# Altium footprint library MainFPs.PcbLib: 215 footprints (part 11 of 14)
Each footprint in its own frame and in the unit in brackets; x right, y up, seen from the top. Pads: shape width x height; smd on the part's side, far side on the other; paste and mask are expansions set on the pad; w line width, h text height; cw(c..) or ccw(c..) is an arc to the next point about the centre after c.
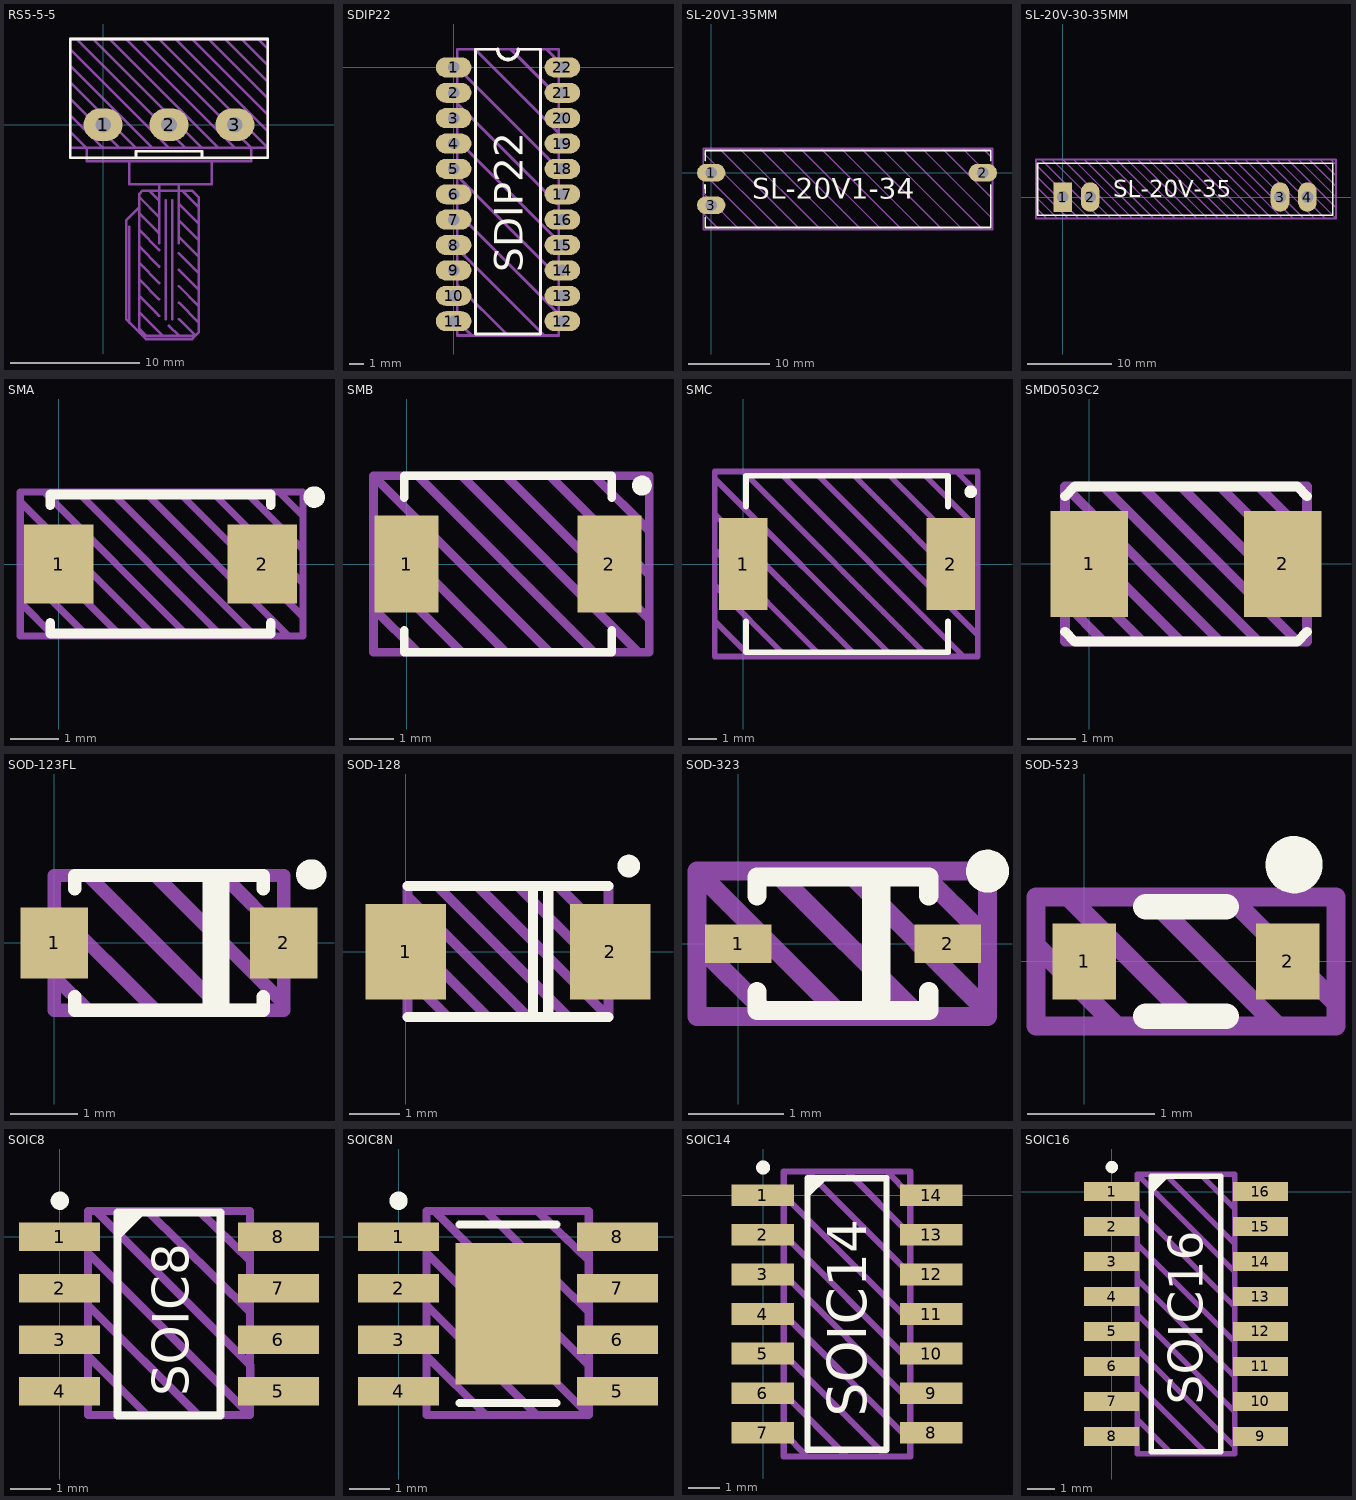
[diagram p10: the footprints below, top view; thin cyan lines are the x and y axes]

## RS5-5-5 [mm]
pads (3):
  oval 3x2.5 hole 1.2: 1(0,0) 2(5.08,0) 3(10.16,0)
Top Overlay:
  lines w0.2: 2.54,-2.54 2.54,-2.032 7.62,-2.032 7.62,-2.54 ; 12.446,-2.54 -2.54,-2.54 -2.54,6.604 12.7,6.604 12.7,-2.54 ; 12.446,-2.54 12.7,-2.54 ; 12.446,-2.54 12.7,-2.54
Top Draw:
  lines w0.2: -2.54,-0.508 -1.27,-1.778 -1.27,-2.794 11.43,-2.794 11.43,-1.778 3.048,6.604 ; -2.54,0.762 0,-1.778 ; -2.54,2.032 1.27,-1.778 ; -2.54,3.302 2.54,-1.778 ; -2.54,4.572 3.81,-1.778 ; -2.54,5.842 5.08,-1.778 ; -2.032,6.604 6.35,-1.778 ; -1.016,-1.778 0.254,-1.778 ; -0.762,6.604 7.62,-1.778 ; 0.508,6.604 8.89,-1.778 ; 1.524,-1.778 2.794,-1.778 ; 1.778,6.604 10.16,-1.778 ; 2.032,-15.24 2.032,-7.874 ; 2.032,-2.794 2.032,-4.572 8.382,-4.572 8.382,-2.794 ; 2.794,-15.748 3.302,-16.256 ; 2.794,-14.478 4.572,-16.256 ; 2.794,-13.208 4.064,-14.478 4.318,-14.732 ; 2.794,-11.938 4.318,-13.462 ; 2.794,-10.668 4.318,-12.192 ; 2.794,-9.398 4.318,-10.922 ; 2.794,-8.128 4.318,-9.652 ; 2.794,-6.858 4.064,-8.128 4.318,-8.382 ; 2.794,-6.35 1.778,-7.366 1.778,-14.986 2.794,-16.002 ; 2.794,-2.794 4.064,-2.794 ; 3.556,-5.08 3.81,-5.334 4.318,-5.842 ; 4.064,-16.256 5.334,-16.256 ; 4.064,-1.778 5.334,-1.778 ; 4.318,-9.144 4.318,-4.572 ; 4.318,-7.112 2.794,-5.588 ; 4.318,6.604 12.7,-1.778 ; 4.826,-14.986 4.826,-13.462 4.826,-5.842 ; 5.08,-15.494 5.842,-16.256 ; 5.334,-14.986 5.334,-13.462 5.334,-5.842 ; 5.334,-2.794 6.604,-2.794 ; 5.588,6.604 12.7,-0.508 ; 5.842,-14.986 7.112,-16.256 ; 5.842,-13.716 7.366,-15.24 ; 5.842,-12.446 7.366,-13.97 ; 5.842,-11.176 7.366,-12.7 ; 5.842,-9.906 7.366,-11.43 ; 5.842,-9.144 5.842,-4.572 7.112,-4.572 ; 5.842,-8.636 7.366,-10.16 ; 5.842,-7.366 7.366,-8.89 ; 5.842,-6.096 7.366,-7.62 ; 6.096,-5.08 6.35,-5.334 7.366,-6.35 ; 6.604,-1.778 7.874,-1.778 ; 6.858,6.604 12.7,0.762 ; 8.128,6.604 12.7,2.032 ; 9.144,-1.778 10.414,-1.778 ; 9.398,6.604 12.7,3.302 ; 10.668,6.604 12.7,4.572 ; 11.938,6.604 12.7,5.842 ; 2.794,-16.002 2.794,-14.224 2.794,-5.588 ; 2.794,-16.002 3.048,-16.256 ; 2.794,-5.588 2.794,-5.334 3.048,-5.08 6.858,-5.08 7.112,-5.334 7.366,-5.588 7.366,-13.716 7.366,-15.494 7.366,-16.002 7.112,-16.256 ; 3.048,-16.256 3.302,-16.51 6.858,-16.51 7.112,-16.256 ; 3.048,-16.256 7.112,-16.256 ; 12.7,-1.778 -2.54,-1.778 -2.54,6.604 12.7,6.604 12.7,-1.778
Top Info:
  text "'.Comment'" at 0,-20.32 h1.25
3D body: height 8.13, standoff 7.11, extent 1.118,-18.796 8.633,-16.383
3D body: height 7.87, standoff 7.37, extent 0.762,-18.796 3.46,-16.002
3D body: height 8.13, standoff 7.11, extent 0.762,-16.383 1.653,-2.413
3D body: height 11.18, standoff 4.06, extent 1.524,-16.383 8.636,-2.413
3D body: height 12.19, standoff 3.05, extent 0.508,-1.778 9.652,-1.016
3D body: height 15.19, standoff 0.05, extent -2.489,0.254 12.649,6.604
3D body: height 13.21, standoff 2.03, extent -0.508,-0.254 10.668,1.016
3D body: height 15.24, standoff 0, extent -2.54,-0.635 12.7,-0.254
3D body: height 7.62, standoff 0.13, extent -2.54,-0.635 12.7,-0.254
3D body: height 0.25, standoff -2.29, extent 9.779,-0.254 10.541,0.254
3D body: height 0.25, standoff -2.29, extent 4.699,-0.254 5.461,0.254
3D body: height 0.25, standoff -2.29, extent -0.381,-0.254 0.381,0.254
3D body: height 5.08, standoff 0.23, extent -1.651,-0.254 1.651,0.254
3D body: height 5.08, standoff 0.23, extent 3.429,-0.254 6.731,0.254
3D body: height 5.08, standoff 0.23, extent 8.509,-0.254 11.811,0.254
3D body: height 10.16, standoff 4.57, extent -1.905,-1.016 12.065,-0.635
3D body: height 9.65, standoff 5.59, extent 3.048,-14.478 7.112,-1.778
3D body: height 7.87, standoff 7.37, extent 0.737,-16.027 0.787,-2.667
3D body: height 7.87, standoff 7.37, extent 0.737,-2.667 1.016,-2.413
3D body: height 4.06, standoff 1.02, extent -1.524,-0.762 1.524,-0.508
3D body: height 4.06, standoff 1.02, extent 3.556,-0.762 6.604,-0.508
3D body: height 4.06, standoff 1.02, extent 8.636,-0.762 11.684,-0.508

## SDIP22 [mm]
pads (22):
  oval 2.5x1.4 hole 0.8: 1(0,0) 2(0,-1.778) 3(0,-3.556) 4(0,-5.334) 5(0,-7.112) 6(0,-8.89) 7(0,-10.668) 8(0,-12.446) 9(0,-14.224) 10(0,-16.002) 11(0,-17.78) 12(7.62,-17.78) 13(7.62,-16.002) 14(7.62,-14.224) 15(7.62,-12.446) 16(7.62,-10.668) 17(7.62,-8.89) 18(7.62,-7.112) 19(7.62,-5.334) 20(7.62,-3.556) 21(7.62,-1.778) 22(7.62,0)
Top Overlay:
  lines w0.2: 3.048,1.27 1.524,1.27 1.524,-18.669 6.096,-18.669 6.096,1.27 4.572,1.27
  lines w0.25: 3.092,1.27 ccw(c3.81,1.27) 4.528,1.27
  text "SDIP22" at 4.826,-14.351 h2
Top Draw:
  lines w0.2: 0.254,-17.78 1.27,-18.796 2.54,-18.796 ; 0.254,-15.24 3.81,-18.796 7.366,-18.796 ; 0.254,-12.7 6.35,-18.796 7.366,-18.796 ; 0.254,-10.16 7.366,-17.272 ; 0.254,-7.62 7.366,-14.732 ; 0.254,-5.08 7.366,-12.192 7.366,-14.732 ; 0.254,-2.54 7.366,-9.652 7.366,-14.732 ; 0.254,0 7.366,-7.112 7.366,-10.16 ; 1.5,1.27 7.366,-4.596 7.366,-6.5 ; 4,1.27 7.366,-2.096 7.366,-4 ; 6.5,1.27 7.366,0.404 7.366,-0.5 ; 7.366,-18.796 7.366,-17.272 ; 7.366,-18.796 7.366,1.27 0.254,1.27 0.254,-18.796 7.366,-18.796 ; 7.366,-17.272 7.366,-14.732
Top Info:
  text "'.Comment'" at -0.381,-20.32 h1
3D body: height 2.09, standoff 0.31, extent 7.112,-2.278 7.747,-1.278
3D body: height 0.38, standoff -3, extent 7.493,-2.032 7.747,-1.524
3D body: height 2.09, standoff 0.31, extent 7.112,-0.5 7.747,0.5
3D body: height 0.38, standoff -3, extent 7.493,-0.254 7.747,0.254
3D body: height 2.09, standoff 0.31, extent 7.112,-4.056 7.747,-3.056
3D body: height 0.38, standoff -3, extent 7.493,-3.81 7.747,-3.302
3D body: height 2.09, standoff 0.31, extent 7.112,-7.612 7.747,-6.612
3D body: height 0.38, standoff -3, extent 7.493,-7.366 7.747,-6.858
3D body: height 2.09, standoff 0.31, extent 7.112,-5.834 7.747,-4.834
3D body: height 0.38, standoff -3, extent 7.493,-5.588 7.747,-5.08
3D body: height 2.09, standoff 0.31, extent 7.112,-9.39 7.747,-8.39
3D body: height 0.38, standoff -3, extent 7.493,-9.144 7.747,-8.636
3D body: height 2.09, standoff 0.31, extent 7.112,-12.946 7.747,-11.946
3D body: height 0.38, standoff -3, extent 7.493,-12.7 7.747,-12.192
3D body: height 2.09, standoff 0.31, extent 7.112,-11.168 7.747,-10.168
3D body: height 0.38, standoff -3, extent 7.493,-10.922 7.747,-10.414
3D body: height 2.09, standoff 0.31, extent 7.112,-14.724 7.747,-13.724
3D body: height 0.38, standoff -3, extent 7.493,-14.478 7.747,-13.97
3D body: height 2.09, standoff 0.31, extent 7.112,-18.28 7.747,-17.28
3D body: height 0.38, standoff -3, extent 7.493,-18.034 7.747,-17.526
3D body: height 2.09, standoff 0.31, extent 7.112,-16.502 7.747,-15.502
3D body: height 0.38, standoff -3, extent 7.493,-16.256 7.747,-15.748
3D body: height 2.09, standoff 0.31, extent -0.127,-16.502 0.508,-15.502
3D body: height 0.38, standoff -3, extent -0.127,-16.256 0.127,-15.748
3D body: height 2.09, standoff 0.31, extent -0.127,-18.28 0.508,-17.28
3D body: height 0.38, standoff -3, extent -0.127,-18.034 0.127,-17.526
3D body: height 2.09, standoff 0.31, extent -0.127,-14.724 0.508,-13.724
3D body: height 0.38, standoff -3, extent -0.127,-14.478 0.127,-13.97
3D body: height 2.09, standoff 0.31, extent -0.127,-11.168 0.508,-10.168
3D body: height 0.38, standoff -3, extent -0.127,-10.922 0.127,-10.414
3D body: height 2.09, standoff 0.31, extent -0.127,-12.946 0.508,-11.946
3D body: height 0.38, standoff -3, extent -0.127,-12.7 0.127,-12.192
3D body: height 2.09, standoff 0.31, extent -0.127,-9.39 0.508,-8.39
3D body: height 0.38, standoff -3, extent -0.127,-9.144 0.127,-8.636
3D body: height 2.09, standoff 0.31, extent -0.127,-5.834 0.508,-4.834
3D body: height 0.38, standoff -3, extent -0.127,-5.588 0.127,-5.08
3D body: height 2.09, standoff 0.31, extent -0.127,-7.612 0.508,-6.612
3D body: height 0.38, standoff -3, extent -0.127,-7.366 0.127,-6.858
3D body: height 2.09, standoff 0.31, extent -0.127,-4.056 0.508,-3.056
3D body: height 0.38, standoff -3, extent -0.127,-3.81 0.127,-3.302
3D body: height 2.09, standoff 0.31, extent -0.127,-0.5 0.508,0.5
3D body: height 0.38, standoff -3, extent -0.127,-0.254 0.127,0.254
3D body: height 2.09, standoff 0.31, extent -0.127,-2.278 0.508,-1.278
3D body: height 0.38, standoff -3, extent -0.127,-2.032 0.127,-1.524
3D body: height 3, standoff 2, extent 0.508,-18.542 7.112,1.016
3D body: height 2.03, standoff 0.25, extent 0.508,-18.542 7.112,1.016

## SL-20V1-35MM [mm]
pads (3):
  oval 3.5x2.2 hole 1.4: 1(0,0) 2(33.5,0) 3(0,-4)
Top Overlay:
  lines w0.2: -0.762,-1.5 -0.75,-2.5 ; -0.75,-5.5 -0.75,-6.75 34.5,-6.75 34.5,-1.5 ; -0.75,1.5 -0.75,2.75 34.5,2.75 34.5,1.5
  text "SL-20V1-34" at 5.08,-3.175 h2.5
Top Draw:
  lines w0.2: -1,-5 1,-7 2.5,-7 ; -1,-2.5 3.5,-7 7.5,-7 ; -1,0 6,-7 12.5,-7 ; -1,2.5 8.5,-7 12.5,-7 ; 1,3 11,-7 12.5,-7 ; 3.5,3 13.5,-7 15,-7 ; 6,3 16,-7 20,-7 ; 8.5,3 18.5,-7 22.5,-7 ; 11,3 21,-7 25,-7 ; 13.5,3 23.5,-7 27.5,-7 ; 16,3 26,-7 30,-7 ; 18.5,3 28.5,-7 32.5,-7 ; 21,3 31,-7 ; 23.5,3 33.5,-7 ; 26,3 34.7,-5.7 ; 28.5,3 34.7,-3.2 ; 30.45,-7 34.7,-7 ; 31,3 34.7,-0.7 ; 32.95,-7 34.7,-7 ; 33.5,3 34.7,1.8 ; 34.7,-7 34.7,-6.1 34.7,3 -1,3 -1,-7 34.7,-7
Top Info:
  text "'.Comment'" at -0.635,-9.525 h2
3D body: height 5.5, standoff 5.4, extent 3,-0.6 31.5,2.7
3D body: height 5.5, standoff 5.4, extent 3,-6.8 31.5,-3.5
3D body: height 5.5, standoff 5, extent -0.5,-6.9 3.5,2.8
3D body: height 3, standoff 0.3, extent 6.3,2.6 9.8,2.8
3D body: height 3, standoff 0, extent 11.3,2.6 13.3,2.8
3D body: height 0.3, standoff 0, extent 11.3,2.1 13.3,2.8
3D body: height 0.3, standoff 0, extent 6.3,1.9 9.8,2.8
3D body: height 0.3, standoff 0, extent 24.2,1.9 27.7,2.8
3D body: height 0.3, standoff 0, extent 20.7,2.1 22.7,2.8
3D body: height 3, standoff 0, extent 20.7,2.6 22.7,2.8
3D body: height 3, standoff 0.3, extent 24.2,2.6 27.7,2.8
3D body: height 3, standoff 0.3, extent 24.2,-6.9 27.7,-6.7
3D body: height 3, standoff 0, extent 20.7,-6.9 22.7,-6.7
3D body: height 0.3, standoff 0, extent 20.7,-6.9 22.7,-6.2
3D body: height 0.3, standoff 0, extent 24.2,-6.9 27.7,-6
3D body: height 0.3, standoff 0, extent 6.3,-6.9 9.8,-6
3D body: height 0.3, standoff 0, extent 11.3,-6.9 13.3,-6.2
3D body: height 3, standoff 0, extent 11.3,-6.9 13.3,-6.7
3D body: height 3, standoff 0.3, extent 6.3,-6.9 9.8,-6.7
3D body: height 5.4, standoff 1.5, extent -0.4,-6.9 34.4,-6.7
3D body: height 5.4, standoff 1.5, extent -0.4,2.6 34.4,2.8
3D body: height 5.4, standoff 1.7, extent -0.5,-6.9 -0.2,2.8
3D body: height 5.4, standoff 1.7, extent 34.2,-6.9 34.5,2.8
3D body: height 1.5, standoff 0.1, extent -0.254,-0.7 0.254,0.7
3D body: height 0.1, standoff -1.78, extent 33.246,-0.508 33.754,0.508
3D body: height 0.1, standoff -1.78, extent -0.254,-4.508 0.254,-3.492
3D body: height 0.1, standoff -1.78, extent -0.254,-0.508 0.254,0.508
3D body: height 2, standoff 0.3, extent -0.2,-6.7 34.2,2.6
3D body: height 4.5, standoff 4, extent 5.427,-4.016 13.237,0.032
3D body: height 10.5, standoff 4.4, extent 6.6,-2.6 12.1,-1.4
3D body: height 1.5, standoff 0.1, extent -0.254,-4.7 0.254,-3.3
3D body: height 1.5, standoff 0.1, extent 33.746,-0.7 34.254,0.7
3D body: height 5.5, standoff 5, extent 30.5,-6.9 34.5,2.8
3D body: height 15.5, standoff 6, extent 7.5,-2.6 11.2,-1.4
3D body: height 5.5, standoff 4.5, extent 3,-4 3.5,0
3D body: height 5.5, standoff 4.5, extent 30.5,-4.3 31.05,-0.3
3D body: height 5.5, standoff 4.5, extent 3,-0.6 31.05,0
3D body: height 5.5, standoff 4.5, extent 3,-4.1 31.05,-3.5

## SL-20V-30-35MM [mm]
pads (4):
  rect 2.2x3.5 hole 1.4: 1(0,0)
  oval 2.2x3.5 hole 1.4: 2(3.25,0) 3(25.75,0) 4(29,0)
Top Overlay:
  lines w0.2: -3,-1 -3,4 32,4 32,0 32,-2.175 -0.175,-2.175 -3,-2.175 -3,0
  text "SL-20V-35" at 6,0 h2
Top Draw:
  lines w0.2: -3.175,-1.27 -1.905,-2.54 -1.27,-2.54 ; -3.175,0 -0.635,-2.54 1.27,-2.54 ; -3.175,1.27 0.635,-2.54 2.54,-2.54 ; -3.175,2.54 1.905,-2.54 5.08,-2.54 3.175,-2.54 -3.175,3.81 ; -2.54,4.445 4.445,-2.54 5.842,-2.54 ; -1.27,4.445 5.715,-2.54 8.89,-2.54 8.255,-2.54 1.27,4.445 ; 0,4.445 6.985,-2.54 10.16,-2.54 ; 2.54,4.445 9.525,-2.54 12.7,-2.54 12.065,-2.54 5.08,4.445 ; 3.81,4.445 10.795,-2.54 15.24,-2.54 ; 6.35,4.445 13.335,-2.54 14.605,-2.54 ; 7.62,4.445 14.605,-2.54 ; 8.89,4.445 15.875,-2.54 16.51,-2.54 14.605,-2.54 ; 10.16,4.445 17.145,-2.54 19.05,-2.54 ; 11.43,4.445 18.415,-2.54 20.32,-2.54 19.685,-2.54 12.7,4.445 ; 13.97,4.445 20.955,-2.54 24.13,-2.54 22.225,-2.54 15.24,4.445 ; 16.51,4.445 23.495,-2.54 26.67,-2.54 ; 17.78,4.445 24.765,-2.54 29.21,-2.54 ; 19.05,4.445 26.035,-2.54 27.94,-2.54 27.305,-2.54 20.32,4.445 ; 21.59,4.445 28.575,-2.54 30.48,-2.54 ; 22.86,4.445 29.845,-2.54 31.75,-2.54 31.115,-2.54 24.13,4.445 ; 25.4,4.445 32.385,-2.54 ; 26.67,4.445 32.385,-1.27 ; 27.94,4.445 32.385,0 32.385,-0.635 ; 29.21,4.445 32.385,1.27 32.385,0.953 ; 30.48,4.445 32.385,2.54 32.385,3.81 31.75,4.445 ; 32.385,-2.54 -3.175,-2.54 -3.175,4.445 32.385,4.445 32.385,-2.54
Top Info:
  text "'.Comment'" at -3.175,-5.08 h2
3D body: height 6, standoff 3, extent 28.448,-0.803 28.6,3
3D body: height 6, standoff 3, extent 0.2,-0.803 28.6,-0.597
3D body: height 6, standoff 3, extent 0.3,2.794 28.7,3
3D body: height 0.1, standoff -1.78, extent 28.492,-0.254 29.508,0.254
3D body: height 0.1, standoff -1.78, extent 25.242,-0.254 26.258,0.254
3D body: height 0.1, standoff -1.78, extent 2.742,-0.254 3.758,0.254
3D body: height 0.1, standoff -1.78, extent -0.508,-0.254 0.508,0.254
3D body: height 10, standoff 5.8, extent 3.175,0.635 8.636,1.397
3D body: height 5.9, standoff 5, extent 2.032,-1 9.842,3.048
3D body: height 6, standoff 5.9, extent -3.302,-2.413 32.258,-0.6
3D body: height 6, standoff 5.9, extent -3.302,2.794 32.258,4.572
3D body: height 6, standoff 5.9, extent 28.448,-2.413 32.258,4.572
3D body: height 6, standoff 5.9, extent -3.302,-2.413 0.508,4.572
3D body: height 2, standoff 0, extent 20.955,4.445 23.495,4.572
3D body: height 2, standoff 0, extent 5.461,4.445 8.001,4.572
3D body: height 2, standoff 0, extent -3.302,-2.413 -2.413,-2.286
3D body: height 5.6, standoff 0.9, extent -3.302,4.445 32.258,4.572
3D body: height 5.6, standoff 0.9, extent -3.302,-2.413 32.258,-2.286
3D body: height 6, standoff 0.9, extent 32.131,-2.159 32.258,4.318
3D body: height 6, standoff 0.9, extent -3.302,-2.159 -3.175,4.318
3D body: height 2, standoff 0.1, extent -3.175,-2.286 32.131,4.445
3D body: height 2, standoff 0, extent -3.302,4.445 -2.413,4.572
3D body: height 2, standoff 0, extent 31.369,4.445 32.258,4.572
3D body: height 2, standoff 0, extent 31.369,-2.413 32.258,-2.286
3D body: height 2, standoff 0, extent 5.461,-2.413 8.001,-2.286
3D body: height 2, standoff 0, extent 20.955,-2.413 23.495,-2.286
3D body: height 6, standoff 3, extent 0.356,-0.803 0.508,3

## SMA [mm] "DO-214AC"
pads (2):
  rect 1.45x1.65 smd: 1(0,0) 2(4.25,0)
Top Overlay:
  circle w0.25: c5.334,1.397 r0.1
  lines w0.2: -0.175,-1.225 -0.175,-1.45 4.425,-1.45 4.425,-1.225 ; -0.175,1.225 -0.175,1.45 4.425,1.45 4.425,1.225
Top Draw:
  lines w0.15: -0.8,-0.8 -0.1,-1.5 0,-1.5 ; -0.8,-0.1 0.6,-1.5 1,-1.5 ; -0.8,0.6 1.3,-1.5 1.6,-1.5 ; -0.8,1.3 2,-1.5 2.1,-1.5 ; -0.4,1.5 -0.3,1.5 2.7,-1.5 ; 0,1.5 0.4,1.5 3.4,-1.5 ; 0.6,1.5 1.1,1.5 4.1,-1.5 ; 1.4,1.5 1.8,1.5 4.8,-1.5 ; 2.4,1.5 2.5,1.5 5.1,-1.1 ; 3.2,1.5 5.1,-0.4 5.1,-0.5 ; 3.9,1.5 5.1,0.3 5.1,0 ; 4.6,1.5 5.1,1 5.1,0.8 ; -0.8,-1.5 5.1,-1.5 5.1,1.5 -0.8,1.5 -0.8,-1.5
Top Info:
  text "'.Comment'" at -0.866,-2.517 h0.75
3D body "SMAA.step": height 2.1, standoff 0, extent -0.395,-1.45 4.645,1.45

## SMB [mm] "DO-214AA"
pads (2):
  rect 1.45x2.2 smd: 1(0,0) 2(4.6,0)
Top Overlay:
  circle w0.25: c5.334,1.778 r0.1
  lines w0.2: -0.05,-1.5 -0.05,-2 4.65,-2 4.65,-1.5 ; -0.05,1.5 -0.05,2 4.65,2 4.65,1.5
Top Draw:
  lines w0.2: -0.75,-1 0.25,-2 0.5,-2 ; -0.75,0 1.25,-2 1.5,-2 ; -0.75,1 2.25,-2 2.5,-2 ; 0.25,2 4.25,-2 4.5,-2 ; 1.25,2 5.25,-2 ; 2.25,2 5.5,-1.25 ; 3.25,2 5.5,-0.25 ; 3.5,-2 3.25,-2 -0.75,2 ; 4.25,2 5.5,0.75 ; -0.75,2 -0.75,-2 5.5,-2 5.5,2 -0.75,2
Top Info:
  text "'.Comment'" at -0.739,-3.025 h0.75
3D body "SODFL127P600-8N.step": height 2.2, standoff 0, extent -0.375,-1.975 4.975,1.975

## SMC [mm] "DO-214AB"
pads (2):
  rect 1.7x3.25 smd: 1(0,0) 2(7.3,0)
Top Overlay:
  circle w0.25: c8.001,2.54 r0.1
  lines w0.2: 0.1,-2.025 0.1,-3.1 7.2,-3.1 7.2,-2.025 ; 0.1,2.025 0.1,3.1 7.2,3.1 7.2,2.025
Top Draw:
  lines w0.2: -1,-2 0.25,-3.25 0.75,-3.25 ; -1,-0.75 1.5,-3.25 1.75,-3.25 ; -1,0.5 2.75,-3.25 ; -1,1.75 4,-3.25 ; -1,3 5.25,-3.25 ; 0,3.25 6.5,-3.25 ; 1.25,3.25 7.75,-3.25 ; 2.5,3.25 8.25,-2.5 ; 3.75,3.25 8.25,-1.25 ; 5,3.25 8.25,0 ; 6.25,3.25 8.25,1.25 ; 7.5,3.25 8.25,2.5 ; -1,-3.25 -1,3.25 8.25,3.25 8.25,-3.25 -1,-3.25
Top Info:
  text "'.Comment'" at -0.943,-4.626 h1
3D body "SODFL127P600-8N.step": height 2.5, standoff 0, extent -0.325,-3.1 7.625,3.1

## SMD0503C2 [mm]
pads (2):
  rect 1.6x2.2 smd: 1(0,0) 2(4,0)
Top Overlay:
  lines w0.2: -0.5,-1.4 -0.3,-1.6 4.3,-1.6 4.5,-1.4 ; -0.5,1.4 -0.3,1.6 4.3,1.6 4.5,1.4
Top Draw:
  lines w0.2: -0.5,-0.8 0.3,-1.6 ; -0.5,0 1.1,-1.6 ; -0.5,0.8 1.9,-1.6 ; 0.3,1.6 3.5,-1.6 ; 1.1,1.6 4.3,-1.6 ; 1.9,1.6 4.5,-1 ; 2.7,-1.6 -0.5,1.6 ; 2.7,1.6 4.5,-0.2 ; 3.5,1.6 4.5,0.6 ; -0.5,1.6 -0.5,-1.6 4.5,-1.6 4.5,1.6 -0.5,1.6
Top Info:
  text "'.Comment'" at -0.124,-2.392 h0.5
3D body: height 1, standoff 0, extent -0.5,-1.6 4.5,1.6

## SOD-123FL [mm]
height 1.2
pads (2):
  rect 1x1.05 smd: 1(0,0) 2(3.4,0)
Top Overlay:
  circle w0.25: c3.81,1.016 r0.1
  lines w0.2: 0.3,-0.8 0.3,-1 3.1,-1 3.1,-0.8 ; 0.3,0.8 0.3,1 3.1,1 3.1,0.8 ; 2.3,-1 2.3,1 ; 2.4,-1 2.4,1 2.6,1 ; 2.5,1 2.5,-1 2.6,-1
Top Draw:
  lines w0.2: 0,-0.5 0.5,-1 0.8,-1 ; 0,0.5 1.5,-1 1.8,-1 ; 0.5,1 2.5,-1 2.7,-1 ; 1,-1 1.3,-1 ; 1.5,1 3.4,-0.9 ; 2,-1 2.3,-1 ; 2.5,1 3.4,0.1 3.4,-0.1 ; 3,-1 3.1,-1 ; 3.4,-0.9 3.4,-0.9 ; 0,-1 0,1 3.4,1 3.4,-1 0,-1
Top Info:
  text "'.Comment'" at -0.408,-1.678 h0.5
3D body "SOD-123FL.step": height 1.2, standoff 0, extent -0.175,-0.95 3.575,0.95

## SOD-128 [mm]
height 1.1
pads (2):
  rect 1.6x1.9 smd: 1(0,0) 2(4.064,0)
Top Overlay:
  circle w0.25: c4.432,1.7 r0.1
  lines w0.2: 0.032,-1.3 4.032,-1.3 ; 0.032,1.3 4.032,1.3 ; 2.532,-1.3 2.532,1.3 ; 2.832,-1.3 2.832,1.3
Top Draw:
  lines w0.2: 0.032,-0.5 0.832,-1.3 ; 0.032,0.3 1.632,-1.3 ; 0.032,1.1 2.432,-1.3 ; 0.632,1.3 3.232,-1.3 ; 1.432,1.3 4.032,-1.3 ; 2.232,1.3 4.032,-0.5 ; 3.032,1.3 4.032,0.3 ; 4.032,-1.3 0.032,-1.3 0.032,1.3 4.032,1.3 4.032,-1.3
Top Info:
  text "'.Comment'" at -1.154,-2.437 h0.75
3D body "SOD-128.step": height 1.1, standoff 0, extent -0.318,-1.35 4.382,1.35

## SOD-323 [mm]
height 0.7
pads (2):
  rect 0.7x0.4 smd: 1(0,0) 2(2.2,0)
Top Overlay:
  circle w0.25: c2.616,0.762 r0.1
  lines w0.2: 0.2,-0.502 0.2,-0.7 2,-0.7 2,-0.502 ; 0.2,0.502 0.2,0.7 2,0.7 2,0.502 ; 1.4,-0.7 1.4,0.7 ; 1.5,-0.7 1.5,0.7
Top Draw:
  lines w0.2: -0.432,0 0.33,-0.762 ; 0.381,0.762 1.905,-0.762 ; 1.092,-0.762 -0.432,0.762 ; 1.143,0.762 2.616,-0.711 ; 1.905,0.762 2.616,0.051 ; -0.432,0.762 2.616,0.762 2.616,-0.762 -0.432,-0.762 -0.432,0.762
Top Info:
  text "'.Comment'" at -0.535,-1.551 h0.5
3D body "SOD-323.step": height 0.72, standoff 0.02, extent -0.1,-0.675 2.3,0.675

## SOD-523 [mm] "SSMini2, SC-79"
pads (2):
  rect 0.5x0.6 smd: 1(0,0) 2(1.6,0)
Top Overlay:
  circle w0.25: c1.651,0.762 r0.1
  lines w0.2: 0.482,-0.432 1.117,-0.432 ; 0.483,0.432 1.118,0.432
Top Draw:
  lines w0.15: -0.381,0.127 0.254,-0.508 ; -0.127,0.508 0.889,-0.508 ; 0.508,0.508 1.524,-0.508 ; 1.143,0.508 1.981,-0.33 ; 1.981,-0.33 1.981,-0.508 -0.381,-0.508 -0.381,0.508 1.981,0.508 1.981,-0.33
Top Info:
  text "'.Comment'" at -0.508,-1.143 h0.5
3D body "SOD-523.step": height 0.6, standoff 0, extent 0,-0.425 1.6,0.425

## SOIC8 [mm]
pads (8):
  rect 2x0.7 smd: 1(-0.008,0) 2(-0.008,-1.27) 3(-0.008,-2.54) 4(-0.008,-3.81) 5(5.392,-3.81) 6(5.392,-2.54) 7(5.392,-1.27) 8(5.392,0)
Top Overlay:
  circle w0.25: c0,0.889 r0.1
  region: 1.422,0.595 1.422,-0.102 2.119,0.595
  lines w0.2: 1.763,0.595 1.778,0.595 ; 2.017,0.595 2.286,0.595 ; 1.422,-4.405 1.422,0.595 3.962,0.595 3.962,-4.405 1.422,-4.405
  text "SOIC8" at 3.175,-3.937 h0.9
Top Draw:
  lines w0.2: 0.692,-4.311 0.692,-4.146 ; 0.692,-2.876 0.692,-2.94 2.143,-4.391 ; 0.692,-1.606 0.692,-1.689 3.404,-4.4 ; 0.692,-0.4 4.692,-4.4 ; 0.692,0.635 0.692,-4.4 4.692,-4.4 ; 0.762,0.635 4.692,0.635 4.692,-4.4 ; 0.889,0.635 4.699,-3.175 4.699,-3.556 ; 2.159,0.635 4.692,-1.86 ; 3.429,0.635 4.692,-0.59
Top Info:
  text "'.Comment'" at -0.508,-5.461 h0.75
3D body "SOIC0.step": height 1.75, standoff 0, extent -0.308,-4.405 5.692,0.595

## SOIC8N [mm]
pads (9):
  rect 2x0.7 smd: 1(0,0) 2(0,-1.27) 3(0,-2.54) 4(0,-3.81) 5(5.4,-3.81) 6(5.4,-2.54) 7(5.4,-1.27) 8(5.4,0)
  rect 2.6x3.5 smd: ""(2.7,-1.9)
Top Overlay:
  circle w0.25: c0,0.889 r0.1
  lines w0.2: 1.499,-4.097 3.899,-4.097 ; 1.5,0.3 3.9,0.3
Top Draw:
  lines w0.2: 0.692,-4.311 0.692,-4.146 ; 0.692,-2.876 0.692,-2.94 2.143,-4.391 ; 0.692,-1.606 0.692,-1.689 3.404,-4.4 ; 0.692,-0.4 4.692,-4.4 ; 0.692,0.635 0.692,-4.4 4.692,-4.4 ; 0.762,0.635 4.692,0.635 4.692,-4.4 ; 0.889,0.635 4.699,-3.175 4.699,-3.556 ; 2.159,0.635 4.692,-1.86 ; 3.429,0.635 4.692,-0.59
Top Info:
  text "'.Comment'" at -0.508,-5.461 h0.75
3D body "SOIC0.step": height 1.75, standoff 0, extent -0.308,-4.405 5.692,0.595

## SOIC14 [mm]
height 1.75
pads (14):
  rect 2x0.7 smd: 1(-0.008,0) 2(-0.008,-1.27) 3(-0.008,-2.54) 4(-0.008,-3.81) 5(-0.008,-5.08) 6(-0.008,-6.35) 7(-0.008,-7.62) 8(5.392,-7.62) 9(5.392,-6.35) 10(5.392,-5.08) 11(5.392,-3.81) 12(5.392,-2.54) 13(5.392,-1.27) 14(5.392,0)
Top Overlay:
  circle w0.25: c0,0.889 r0.1
  region: 1.422,0.595 1.422,-0.102 2.119,0.595
  lines w0.2: 1.422,-8.16 3.962,-8.16 3.962,0.54 1.422,0.54 1.422,-8.16
  text "SOIC14" at 3.302,-7.112 h1.25
Top Draw:
  lines w0.2: 0.66,-7.62 1.422,-8.382 ; 0.66,-6.35 2.692,-8.382 1.422,-8.382 ; 0.66,0 4.724,-4.064 4.724,-5.08 4.724,-3.81 ; 1.422,0.762 4.724,-2.54 ; 2.692,0.762 4.724,-1.27 ; 3.962,0.762 4.724,0 ; 4.724,-6.35 4.724,-5.334 0.66,-1.27 0.66,-2.54 4.724,-6.604 4.724,-8.382 ; 1.422,-8.382 3.962,-8.382 0.66,-5.08 0.66,-3.81 4.724,-7.874 4.724,-8.382 ; 4.724,-8.382 4.724,0.762 0.66,0.762 0.66,-8.382 4.724,-8.382
Top Info:
  text "'.Comment'" at -0.508,-9.398 h0.75
3D body "SOIC16(T).step": height 1.75, standoff 0, extent -0.308,-8.16 5.692,0.54

## SOIC16 [mm]
height 1.75
pads (16):
  rect 2x0.7 smd: 1(-0.008,0) 2(-0.008,-1.27) 3(-0.008,-2.54) 4(-0.008,-3.81) 5(-0.008,-5.08) 6(-0.008,-6.35) 7(-0.008,-7.62) 8(-0.008,-8.89) 9(5.392,-8.89) 10(5.392,-7.62) 11(5.392,-6.35) 12(5.392,-5.08) 13(5.392,-3.81) 14(5.392,-2.54) 15(5.392,-1.27) 16(5.392,0)
Top Overlay:
  circle w0.25: c0,0.889 r0.1
  region: 1.422,0.595 1.422,-0.102 2.119,0.595
  lines w0.2: 1.596,0.555 1.93,0.555 ; 1.85,0.555 2.184,0.555 ; 2.104,0.555 2.692,0.555 ; 1.422,-9.445 3.962,-9.445 3.962,0.555 1.422,0.555 1.422,-9.445
  text "SOIC16" at 3.302,-7.747 h1.25
Top Draw:
  lines w0.2: 0.914,-8.255 2.184,-9.525 ; 0.914,-6.985 3.454,-9.525 3.962,-9.525 ; 0.914,-5.715 4.47,-9.271 ; 0.914,-4.445 4.47,-8.001 4.47,-8.255 4.47,-6.731 0.914,-3.175 ; 0.914,-1.905 4.47,-5.461 4.47,-5.715 ; 0.914,-0.635 4.47,-4.191 ; 1.422,0.635 1.93,0.635 4.47,-1.905 ; 2.184,0.635 3.2,0.635 4.47,-0.635 ; 4.47,-4.445 4.47,-4.191 ; 0.914,0.635 0.914,-9.525 4.47,-9.525 4.47,0.635 0.914,0.635 ; 0.914,0.635 4.47,-2.921 4.47,-4.191
Top Info:
  text "'.Comment'" at -0.254,-10.541 h0.75
3D body "SOIC16.step": height 1.75, standoff 0, extent -0.308,-9.445 5.692,0.555